# Altium footprint library ParsaLibrary.PcbLib: 526 footprints (part 31 of 33)
Each footprint in its own frame and in the unit in brackets; x right, y up, seen from the top. Pads: shape width x height; smd on the part's side, far side on the other; paste and mask are expansions set on the pad; w line width, h text height; cw(c..) or ccw(c..) is an arc to the next point about the centre after c.
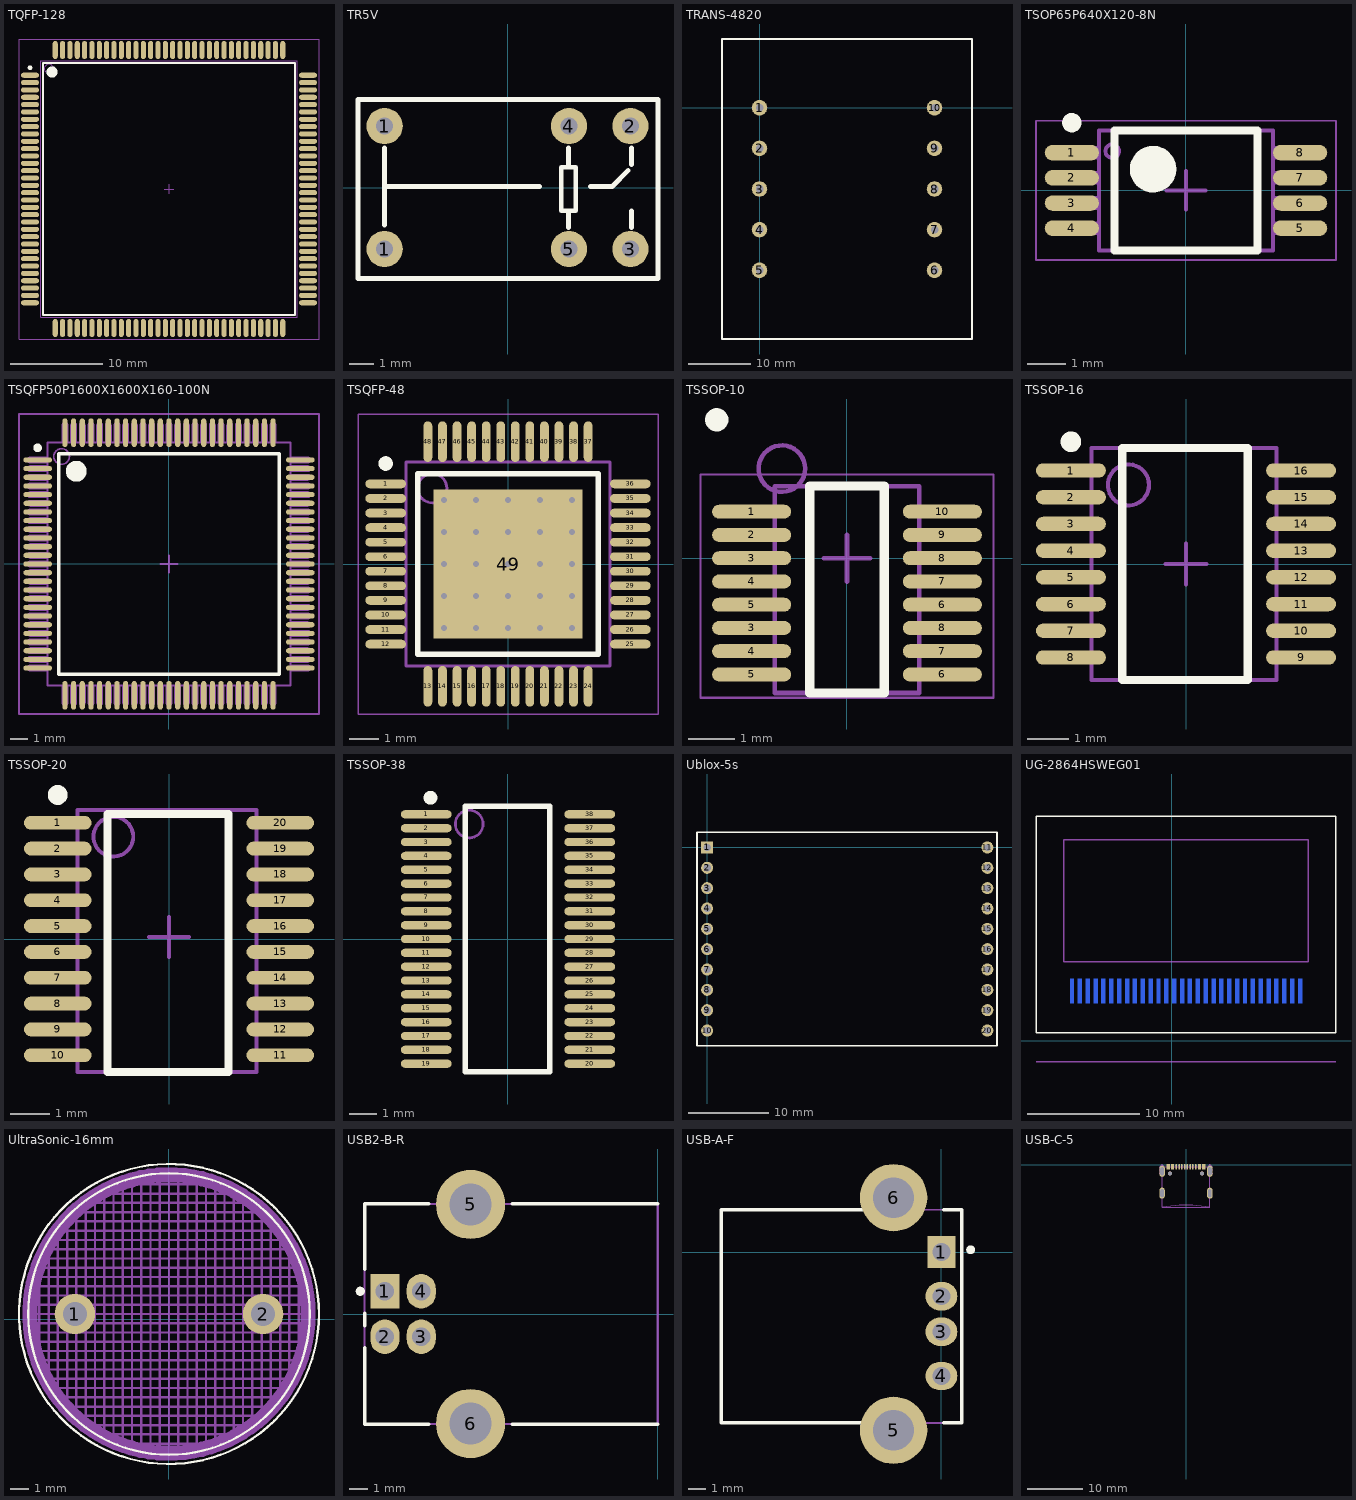
[diagram p30: the footprints below, top view; thin cyan lines are the x and y axes]

## TQFP-128 [mm]
pads (128):
  oval 1.95x0.55 smd: 1(-1116.062,-1183.305) 2(-1116.062,-1184.105) 3(-1116.062,-1184.905) 4(-1116.062,-1185.705) 5(-1116.062,-1186.505) 6(-1116.062,-1187.305) 7(-1116.062,-1188.105) 8(-1116.062,-1188.905) 9(-1116.062,-1189.705) 10(-1116.062,-1190.505) 11(-1116.062,-1191.305) 12(-1116.062,-1192.105) 13(-1116.062,-1192.905) 14(-1116.062,-1193.705) 15(-1116.062,-1194.505) 16(-1116.062,-1195.305) 17(-1116.062,-1196.105) 18(-1116.062,-1196.905) 19(-1116.062,-1197.705) 20(-1116.062,-1198.505) 21(-1116.062,-1199.305) 22(-1116.062,-1200.105) 23(-1116.062,-1200.905) 24(-1116.062,-1201.705) 25(-1116.062,-1202.505) 26(-1116.062,-1203.305) 27(-1116.062,-1204.105) 28(-1116.062,-1204.905) 29(-1116.062,-1205.705) 30(-1116.062,-1206.505) 31(-1116.062,-1207.305) 32(-1116.062,-1208.105) 65(-1085.762,-1208.105) 66(-1085.762,-1207.305) 67(-1085.762,-1206.505) 68(-1085.762,-1205.705) 69(-1085.762,-1204.905) 70(-1085.762,-1204.105) 71(-1085.762,-1203.305) 72(-1085.762,-1202.505) 73(-1085.762,-1201.705) 74(-1085.762,-1200.905) 75(-1085.762,-1200.105) 76(-1085.762,-1199.305) 77(-1085.762,-1198.505) 78(-1085.762,-1197.705) 79(-1085.762,-1196.905) 80(-1085.762,-1196.105) 81(-1085.762,-1195.305) 82(-1085.762,-1194.505) 83(-1085.762,-1193.705) 84(-1085.762,-1192.905) 85(-1085.762,-1192.105) 86(-1085.762,-1191.305) 87(-1085.762,-1190.505) 88(-1085.762,-1189.705) 89(-1085.762,-1188.905) 90(-1085.762,-1188.105) 91(-1085.762,-1187.305) 92(-1085.762,-1186.505) 93(-1085.762,-1185.705) 94(-1085.762,-1184.905) 95(-1085.762,-1184.105) 96(-1085.762,-1183.305)
  oval 0.55x1.95 smd: 33(-1113.312,-1210.855) 34(-1112.512,-1210.855) 35(-1111.712,-1210.855) 36(-1110.912,-1210.855) 37(-1110.112,-1210.855) 38(-1109.312,-1210.855) 39(-1108.512,-1210.855) 40(-1107.712,-1210.855) 41(-1106.912,-1210.855) 42(-1106.112,-1210.855) 43(-1105.312,-1210.855) 44(-1104.512,-1210.855) 45(-1103.712,-1210.855) 46(-1102.912,-1210.855) 47(-1102.112,-1210.855) 48(-1101.312,-1210.855) 49(-1100.512,-1210.855) 50(-1099.712,-1210.855) 51(-1098.912,-1210.855) 52(-1098.112,-1210.855) 53(-1097.312,-1210.855) 54(-1096.512,-1210.855) 55(-1095.712,-1210.855) 56(-1094.912,-1210.855) 57(-1094.112,-1210.855) 58(-1093.312,-1210.855) 59(-1092.512,-1210.855) 60(-1091.712,-1210.855) 61(-1090.912,-1210.855) 62(-1090.112,-1210.855) 63(-1089.312,-1210.855) 64(-1088.512,-1210.855) 97(-1088.512,-1180.555) 98(-1089.312,-1180.555) 99(-1090.112,-1180.555) 100(-1090.912,-1180.555) 101(-1091.712,-1180.555) 102(-1092.512,-1180.555) 103(-1093.312,-1180.555) 104(-1094.112,-1180.555) 105(-1094.912,-1180.555) 106(-1095.712,-1180.555) 107(-1096.512,-1180.555) 108(-1097.312,-1180.555) 109(-1098.112,-1180.555) 110(-1098.912,-1180.555) 111(-1099.712,-1180.555) 112(-1100.512,-1180.555) 113(-1101.312,-1180.555) 114(-1102.112,-1180.555) 115(-1102.912,-1180.555) 116(-1103.712,-1180.555) 117(-1104.512,-1180.555) 118(-1105.312,-1180.555) 119(-1106.112,-1180.555) 120(-1106.912,-1180.555) 121(-1107.712,-1180.555) 122(-1108.512,-1180.555) 123(-1109.312,-1180.555) 124(-1110.112,-1180.555) 125(-1110.912,-1180.555) 126(-1111.712,-1180.555) 127(-1112.512,-1180.555) 128(-1113.312,-1180.555)
Top Overlay:
  circle w0.6: c-1113.662,-1182.955 r0.3
  circle w0.25: c-1116.062,-1182.48 r0.125
  lines w0.2: -1114.662,-1209.455 -1087.162,-1209.455 -1087.162,-1181.955 -1114.662,-1181.955 -1114.662,-1209.455
Mechanical 13:
  circle w0.1: c-1114.012,-1182.605 r0.5
  lines w0.1: -1114.912,-1209.705 -1086.912,-1209.705 -1086.912,-1181.705 -1114.912,-1181.705 -1114.912,-1209.705
Mechanical 15:
  lines w0.1: -1101.412,-1195.705 -1100.412,-1195.705 ; -1100.912,-1196.205 -1100.912,-1195.205 ; -1117.262,-1212.055 -1084.562,-1212.055 -1084.562,-1179.355 -1117.262,-1179.355 -1117.262,-1212.055

## TR5V [mm] "TIANBAO RELAY"
pads (6):
  round 1.5 hole 0.7: 1(-5.08,-2.54) 1(-5.08,2.54) 2(5.08,2.54) 3(5.08,-2.54) 4(2.54,2.54) 5(2.54,-2.54)
Top Overlay:
  lines w0.2: -5.08,-1.56 -5.08,1.64 ; -5.08,0.04 1.32,0.04 ; 2.52,-1.66 2.52,-0.96 ; 2.52,0.84 2.52,1.64 ; 3.42,0.04 4.32,0.04 4.99,0.71 ; 5.12,-1.66 5.12,-0.96 ; 5.12,0.94 5.12,1.64 ; 2.52,-0.96 2.22,-0.96 2.22,0.84 2.82,0.84 2.82,-0.86 2.82,-0.96 2.52,-0.96 ; -6.18,-3.76 6.22,-3.76 6.22,3.64 -6.18,3.64 -6.18,-3.76
3D body "User Library-TR5V L-S-Z.step": height 10, standoff -3.5, extent -6.2,-3.7 6.2,3.7

## TRANS-4820 [mm]
pads (10):
  round 2.5 hole 1.2: 1(0,0) 2(0,-6.5) 3(0,-13) 4(0,-19.5) 5(0,-26) 6(28,-26) 7(28,-19.5) 8(28,-13) 9(28,-6.5) 10(28,0)
Top Overlay:
  lines w0.254: -6,-37 34,-37 34,11 -6,11 -6,-37

## TSOP65P640X120-8N [mm]
pads (8):
  oval 1.4x0.4 smd: 1(-2.95,0.975) 2(-2.95,0.325) 3(-2.95,-0.325) 4(-2.95,-0.975) 5(2.95,-0.975) 6(2.95,-0.325) 7(2.95,0.325) 8(2.95,0.975)
Top Overlay:
  circle w0.6: c-0.85,0.55 r0.3
  circle w0.25: c-2.95,1.75 r0.125
  lines w0.2: -1.85,-1.55 1.85,-1.55 1.85,1.55 -1.85,1.55 -1.85,-1.55
Mechanical 7:
  circle w0.1: c-1.905,1.016 r0.175
  lines w0.1: -2.25,-1.55 2.25,-1.55 2.25,1.55 -2.25,1.55 -2.25,-1.55
  lines w0.102: -2.25,-1.1 -3.25,-1.1 -3.25,-0.85 -2.25,-0.85 ; -2.25,-0.45 -3.25,-0.45 -3.25,-0.2 -2.25,-0.2 ; -2.25,0.2 -3.25,0.2 -3.25,0.45 -2.25,0.45 ; -2.25,0.85 -3.25,0.85 -3.25,1.1 -2.25,1.1 ; 2.25,-1.1 3.25,-1.1 3.25,-0.85 2.25,-0.85 ; 2.25,-0.45 3.25,-0.45 3.25,-0.2 2.25,-0.2 ; 2.25,0.2 3.25,0.2 3.25,0.45 2.25,0.45 ; 2.25,0.85 3.25,0.85 3.25,1.1 2.25,1.1
  text ".Designator" at -0.559,-0.178 h0.38
Mechanical 15:
  lines w0.05: -3.875,-1.8 3.875,-1.8 3.875,1.8 -3.875,1.8 -3.875,-1.8
  lines w0.1: -0.5,0 0.5,0 ; 0,-0.5 0,0.5
3D body "TSOP65P640X120-8N_asfdasdf.step": height 1.2, standoff 0, extent -3.2,-1.55 3.2,1.55

## TSQFP50P1600X1600X160-100N [mm]
pads (100):
  oval 1.65x0.3 smd mask+0.05: 1(-7.575,6) 2(-7.575,5.5) 3(-7.575,5) 4(-7.575,4.5) 5(-7.575,4) 6(-7.575,3.5) 7(-7.575,3) 8(-7.575,2.5) 9(-7.575,2) 10(-7.575,1.5) 11(-7.575,1) 12(-7.575,0.5) 13(-7.575,0) 14(-7.575,-0.5) 15(-7.575,-1) 16(-7.575,-1.5) 17(-7.575,-2) 18(-7.575,-2.5) 19(-7.575,-3) 20(-7.575,-3.5) 21(-7.575,-4) 22(-7.575,-4.5) 23(-7.575,-5) 24(-7.575,-5.5) 25(-7.575,-6) 51(7.575,-6) 52(7.575,-5.5) 53(7.575,-5) 54(7.575,-4.5) 55(7.575,-4) 56(7.575,-3.5) 57(7.575,-3) 58(7.575,-2.5) 59(7.575,-2) 60(7.575,-1.5) 61(7.575,-1) 62(7.575,-0.5) 63(7.575,0) 64(7.575,0.5) 65(7.575,1) 66(7.575,1.5) 67(7.575,2) 68(7.575,2.5) 69(7.575,3) 70(7.575,3.5) 71(7.575,4) 72(7.575,4.5) 73(7.575,5) 74(7.575,5.5) 75(7.575,6)
  oval 0.3x1.65 smd mask+0.05: 26(-6,-7.575) 27(-5.5,-7.575) 28(-5,-7.575) 29(-4.5,-7.575) 30(-4,-7.575) 31(-3.5,-7.575) 32(-3,-7.575) 33(-2.5,-7.575) 34(-2,-7.575) 35(-1.5,-7.575) 36(-1,-7.575) 37(-0.5,-7.575) 38(0,-7.575) 39(0.5,-7.575) 40(1,-7.575) 41(1.5,-7.575) 42(2,-7.575) 43(2.5,-7.575) 44(3,-7.575) 45(3.5,-7.575) 46(4,-7.575) 47(4.5,-7.575) 48(5,-7.575) 49(5.5,-7.575) 50(6,-7.575) 76(6,7.575) 77(5.5,7.575) 78(5,7.575) 79(4.5,7.575) 80(4,7.575) 81(3.5,7.575) 82(3,7.575) 83(2.5,7.575) 84(2,7.575) 85(1.5,7.575) 86(1,7.575) 87(0.5,7.575) 88(0,7.575) 89(-0.5,7.575) 90(-1,7.575) 91(-1.5,7.575) 92(-2,7.575) 93(-2.5,7.575) 94(-3,7.575) 95(-3.5,7.575) 96(-4,7.575) 97(-4.5,7.575) 98(-5,7.575) 99(-5.5,7.575) 100(-6,7.575)
Top Overlay:
  circle w0.25: c-7.575,6.7 r0.125
  circle w0.6: c-5.35,5.35 r0.3
  lines w0.2: -6.35,-6.35 -6.35,6.35 6.35,6.35 6.35,-6.35 -6.35,-6.35
Mechanical 7:
  drawing of 405 lines, arcs and shapes, not listed
Mechanical 15:
  lines w0.1: -0.5,0 0.5,0 ; 0,-0.5 0,0.5 ; -8.65,-8.65 -8.65,8.65 8.65,8.65 8.65,-8.65 -8.65,-8.65
3D body "User Library-LQFP-100 (2).step": height 1.6, standoff 0, extent -8.001,-8 7.999,8

## TSQFP-48 [mm] "TSQFP, 48-Leads, Body 7.00x7.00mm, Pitch 0.50mm, Thermal Pad 5.10x5.10mm, IPC Medium Density"
height 1.2
pads (49):
  oval 1.4x0.3 smd: 1(-4.2,2.75) 2(-4.2,2.25) 3(-4.2,1.75) 4(-4.2,1.25) 5(-4.2,0.75) 6(-4.2,0.25) 7(-4.2,-0.25) 8(-4.2,-0.75) 9(-4.2,-1.25) 10(-4.2,-1.75) 11(-4.2,-2.25) 12(-4.2,-2.75) 25(4.2,-2.75) 26(4.2,-2.25) 27(4.2,-1.75) 28(4.2,-1.25) 29(4.2,-0.75) 30(4.2,-0.25) 31(4.2,0.25) 32(4.2,0.75) 33(4.2,1.25) 34(4.2,1.75) 35(4.2,2.25) 36(4.2,2.75)
  oval 0.3x1.4 smd: 13(-2.75,-4.2) 14(-2.25,-4.2) 15(-1.75,-4.2) 16(-1.25,-4.2) 17(-0.75,-4.2) 18(-0.25,-4.2) 19(0.25,-4.2) 20(0.75,-4.2) 21(1.25,-4.2) 22(1.75,-4.2) 23(2.25,-4.2) 24(2.75,-4.2) 37(2.75,4.2) 38(2.25,4.2) 39(1.75,4.2) 40(1.25,4.2) 41(0.75,4.2) 42(0.25,4.2) 43(-0.25,4.2) 44(-0.75,4.2) 45(-1.25,4.2) 46(-1.75,4.2) 47(-2.25,4.2) 48(-2.75,4.2)
  rect 5.1x5.1 smd: 49(0,0)
via 2.2,-2.2 diameter 0.5 hole 0.2
via 1.1,-2.2 diameter 0.5 hole 0.2
via 0,-2.2 diameter 0.5 hole 0.2
via -1.1,-2.2 diameter 0.5 hole 0.2
via -2.2,-2.2 diameter 0.5 hole 0.2
via 2.2,-1.1 diameter 0.5 hole 0.2
via 1.1,-1.1 diameter 0.5 hole 0.2
via 0,-1.1 diameter 0.5 hole 0.2
via -1.1,-1.1 diameter 0.5 hole 0.2
via -2.2,-1.1 diameter 0.5 hole 0.2
via 2.2,0 diameter 0.5 hole 0.2
via 1.1,0 diameter 0.5 hole 0.2
via 0,0 diameter 0.5 hole 0.2
via -1.1,0 diameter 0.5 hole 0.2
via -2.2,0 diameter 0.5 hole 0.2
via 2.2,1.1 diameter 0.5 hole 0.2
via 1.1,1.1 diameter 0.5 hole 0.2
via 0,1.1 diameter 0.5 hole 0.2
via -1.1,1.1 diameter 0.5 hole 0.2
via -2.2,1.1 diameter 0.5 hole 0.2
via 2.2,2.2 diameter 0.5 hole 0.2
via 1.1,2.2 diameter 0.5 hole 0.2
via 0,2.2 diameter 0.5 hole 0.2
via -1.1,2.2 diameter 0.5 hole 0.2
via -2.2,2.2 diameter 0.5 hole 0.2
Top Overlay:
  circle w0.25: c-4.2,3.45 r0.125
  lines w0.2: -3.1,-3.1 3.1,-3.1 3.1,3.1 -3.1,3.1 -3.1,-3.1
Mechanical 13:
  circle w0.1: c-2.6,2.6 r0.5
  lines w0.1: -3.5,-3.5 3.5,-3.5 3.5,3.5 -3.5,3.5 -3.5,-3.5
Mechanical 15:
  lines w0.05: -5.15,-5.15 5.15,-5.15 5.15,5.15 -5.15,5.15 -5.15,-5.15
  lines w0.1: -0.5,0 0.5,0 ; 0,-0.5 0,0.5
3D body "TSQFP-48.step": height 1.2, standoff 0, extent -4.5,-4.5 4.5,4.5

## TSSOP-10 [mm]
pads (16):
  oval 1.7x0.3 smd: 1(-2.05,1) 2(-2.05,0.5) 3(-2.05,-1.5) 3(-2.05,0) 4(-2.05,-2) 4(-2.05,-0.5) 5(-2.05,-2.5) 5(-2.05,-1) 6(2.05,-2.5) 6(2.05,-1) 7(2.05,-2) 7(2.05,-0.5) 8(2.05,-1.5) 8(2.05,0) 9(2.05,0.5) 10(2.05,1)
Top Overlay:
  circle w0.25: c-2.8,2.975 r0.125
  lines w0.2: -0.8,-2.9 -0.8,1.55 0.8,1.55 0.8,-2.9 -0.8,-2.9
Mechanical 13:
  circle w0.1: c-1.4,1.925 r0.5
  lines w0.1: -1.55,-2.9 -1.55,1.55 1.55,1.55 1.55,-2.9 -1.55,-2.9
Mechanical 15:
  lines w0.05: -3.15,-3 3.15,-3 3.15,1.8 -3.15,1.8 -3.15,-3
  lines w0.1: -0.5,0 0.5,0 ; 0,-0.5 0,0.5

## TSSOP-16 [mm]
pads (16):
  oval 1.7x0.35 smd: 1(-2.8,2.275) 2(-2.8,1.625) 3(-2.8,0.975) 4(-2.8,0.325) 5(-2.8,-0.325) 6(-2.8,-0.975) 7(-2.8,-1.625) 8(-2.8,-2.275) 9(2.8,-2.275) 10(2.8,-1.625) 11(2.8,-0.975) 12(2.8,-0.325) 13(2.8,0.325) 14(2.8,0.975) 15(2.8,1.625) 16(2.8,2.275)
Top Overlay:
  circle w0.25: c-2.8,2.975 r0.125
  lines w0.2: -1.55,-2.825 -1.55,2.825 1.5,2.825 1.5,-2.825 -1.55,-2.825
Mechanical 13:
  circle w0.1: c-1.4,1.925 r0.5
  lines w0.1: -2.3,-2.825 -2.3,2.825 2.2,2.825 2.2,-2.825 -2.3,-2.825
Mechanical 15:
  lines w0.1: -0.5,0 0.5,0 ; 0,-0.5 0,0.5
3D body "User Library-TSSOP-16-1.step": height 1.1, standoff 0, extent -3.2,-2.5 3.2,2.5

## TSSOP-20 [mm]
pads (20):
  oval 1.7x0.35 smd: 1(-2.8,2.925) 2(-2.8,2.275) 3(-2.8,1.625) 4(-2.8,0.975) 5(-2.8,0.325) 6(-2.8,-0.325) 7(-2.8,-0.975) 8(-2.8,-1.625) 9(-2.8,-2.275) 10(-2.8,-2.925) 11(2.8,-2.925) 12(2.8,-2.275) 13(2.8,-1.625) 14(2.8,-0.975) 15(2.8,-0.325) 16(2.8,0.325) 17(2.8,0.975) 18(2.8,1.625) 19(2.8,2.275) 20(2.8,2.925)
Top Overlay:
  circle w0.25: c-2.8,3.625 r0.125
  lines w0.2: -1.55,-3.35 -1.55,3.15 1.5,3.15 1.5,-3.35 -1.55,-3.35
Mechanical 13:
  circle w0.1: c-1.4,2.575 r0.5
  lines w0.1: -2.3,-3.35 -2.3,3.25 2.2,3.25 2.2,-3.35 -2.3,-3.35
Mechanical 15:
  lines w0.1: -0.5,0.05 0.5,0.05 ; 0,-0.45 0,0.55
3D body "User Library-TSSOP20.step": height 1.09, standoff 0, extent -3.14,-3.35 3.14,3.15

## TSSOP-38 [mm] "0.5mm Pitch"
pads (38):
  oval 1.83x0.3 smd: 1(-2.95,4.5) 2(-2.95,4) 3(-2.95,3.5) 4(-2.95,3) 5(-2.95,2.5) 6(-2.95,2) 7(-2.95,1.5) 8(-2.95,1) 9(-2.95,0.5) 10(-2.95,0) 11(-2.95,-0.5) 12(-2.95,-1) 13(-2.95,-1.5) 14(-2.95,-2) 15(-2.95,-2.5) 16(-2.95,-3) 17(-2.95,-3.5) 18(-2.95,-4) 19(-2.95,-4.5) 20(2.95,-4.5) 21(2.95,-4) 22(2.95,-3.5) 23(2.95,-3) 24(2.95,-2.5) 25(2.95,-2) 26(2.95,-1.5) 27(2.95,-1) 28(2.95,-0.5) 29(2.95,0) 30(2.95,0.5) 31(2.95,1) 32(2.95,1.5) 33(2.95,2) 34(2.95,2.5) 35(2.95,3) 36(2.95,3.5) 37(2.95,4) 38(2.95,4.5)
Top Overlay:
  circle w0.25: c-2.8,5.1 r0.125
  lines w0.2: -1.55,-4.8 1.5,-4.8 1.5,4.8 -1.55,4.8 -1.55,-4.8
Mechanical 13:
  circle w0.1: c-1.4,4.15 r0.5
3D body "TSSOP-38 0.50p 4.4mm.step": height 1, standoff 0, extent -3.15,-4.85 3.15,4.85

## Ublox-5s [mm] "Ublox-5s GPS Module"
pads (20):
  rect 1.5x1.5 hole 0.9: 1(0,0)
  round 1.5 hole 0.9: 2(0,-2.54) 3(0,-5.08) 4(0,-7.62) 5(0,-10.16) 6(0,-12.7) 7(0,-15.24) 8(0,-17.78) 9(0,-20.32) 10(0,-22.86) 11(35,0) 12(35,-2.54) 13(35,-5.08) 14(35,-7.62) 15(35,-10.16) 16(35,-12.7) 17(35,-15.24) 18(35,-17.78) 19(35,-20.32) 20(35,-22.86)
Top Overlay:
  lines w0.2: -1.27,-24.765 -1.27,1.905 36.195,1.905 36.195,-0.635 36.195,-24.765 -1.27,-24.765

## UG-2864HSWEG01 [mm] "0.96INCH OLED 128x64"
pads (30):
  rect 0.35x2.2 smd far side: 1(-8.878,4.437) 2(-8.178,4.437) 3(-7.478,4.437) 4(-6.778,4.437) 5(-6.078,4.437) 6(-5.378,4.437) 7(-4.678,4.437) 8(-3.978,4.437) 9(-3.278,4.437) 10(-2.578,4.437) 11(-1.878,4.437) 12(-1.178,4.437) 13(-0.478,4.437) 14(0.222,4.437) 15(0.922,4.437) 16(1.622,4.437) 17(2.322,4.437) 18(3.022,4.437) 19(3.722,4.437) 20(4.422,4.437) 21(5.122,4.437) 22(5.822,4.437) 23(6.522,4.437) 24(7.222,4.437) 25(7.922,4.437) 26(8.622,4.437) 27(9.322,4.437) 28(10.022,4.437) 29(10.722,4.437) 30(11.422,4.437)
Top Overlay:
  lines w0.127: -12.081,19.997 14.622,19.997 14.622,0.737 -12.078,0.737 -12.081,19.997
Mechanical 16:
  lines w0.127: -12.078,-1.863 14.622,-1.863 ; -9.6,7.033 12.144,7.033 12.144,17.897 -9.6,17.897 -9.6,7.033
  text "PCB EDGE (1.6mm)" at -3.928,-1.363 h1.26
Mechanical 30:
  text "1" at -8.678,6.149 h0.69
  text "10" at -2.378,6.049 h0.69
  text "20" at 4.572,6.049 h0.69
  text "30" at 11.722,6.049 h0.69
3D body "User Library-096OLED.step": height 2.02, standoff -1.82, extent -12.05,-2.216 14.65,20

## UltraSonic-16mm [mil]
pads (2):
  round 86 hole 51.18: 1(-198.94,11.06) 2(201.06,11.06)
Top Overlay:
  circle w5: c1.06,11.06 r299.32
  circle w5: c1.06,11.06 r318.9
Mechanical 1:
  circle w32: c1.06,11.06 r295.93
  lines w5: -294.22,-8.63 296.34,-8.63 ; -294.22,11.06 296.34,11.06 ; -294.22,30.75 296.34,30.75 ; -294.22,50.43 296.34,50.43 ; -274.53,-87.37 276.65,-87.37 276.65,109.49 -274.53,109.49 -274.53,-107.05 276.65,-107.05 ; -274.53,-67.68 276.65,-67.68 ; -274.53,-48 276.65,-48 ; -274.53,-28.31 276.65,-28.31 ; -274.53,70.12 276.65,70.12 ; -274.53,89.8 276.65,89.8 ; -254.85,-126.74 256.97,-126.74 256.97,148.86 -254.85,148.86 -254.85,-146.42 256.97,-146.42 ; -254.85,129.17 256.97,129.17 ; -235.16,168.54 237.28,168.54 ; -38.31,306.34 -38.31,-284.22 -18.63,-284.22 ; 40.43,-284.22 40.43,-264.53 ; 40.43,306.34 40.43,286.65 ; -156.42,-225.16 -156.42,247.28 ; -156.42,-225.16 -176.11,-225.16 -176.11,247.28 -156.42,247.28 ; -156.42,-225.16 158.54,-225.16 ; -156.42,247.28 158.54,247.28 ; -117.05,-244.85 -117.05,266.97 ; -117.05,-244.85 119.17,-244.85 ; -117.05,-244.85 -136.74,-244.85 -136.74,266.97 -117.05,266.97 ; -117.05,266.97 99.49,266.97 ; -77.68,-264.53 -77.68,286.65 ; -77.68,-264.53 -58,-264.53 ; -77.68,-264.53 -97.37,-264.53 -97.37,286.65 -77.68,286.65 ; -77.68,286.65 -58,286.65 ; -58,-264.53 -58,286.65 ; -58,-264.53 40.43,-264.53 ; -58,286.65 20.75,286.65 ; -18.63,-284.22 1.06,-284.22 ; -18.63,-284.22 -18.63,306.34 1.06,306.34 ; 1.06,-284.22 1.06,306.34 ; 1.06,-284.22 20.75,-284.22 20.75,286.65 ; 1.06,306.34 20.75,306.34 20.75,286.65 ; 20.75,286.65 40.43,286.65 ; 40.43,-264.53 40.43,286.65 ; 40.43,-264.53 60.12,-264.53 ; 40.43,286.65 79.8,286.65 ; 60.12,-264.53 60.12,286.65 79.8,286.65 ; 60.12,-264.53 99.49,-264.53 ; 79.8,286.65 79.8,-264.53 99.49,-264.53 ; 79.8,286.65 99.49,286.65 99.49,266.97 ; 99.49,-264.53 99.49,266.97 ; 99.49,-264.53 99.49,-244.85 119.17,-244.85 ; 99.49,266.97 119.17,266.97 ; 119.17,-244.85 119.17,266.97 ; 119.17,-244.85 138.86,-244.85 138.86,266.97 119.17,266.97 ; 158.54,-225.16 158.54,247.28 ; 158.54,-225.16 178.23,-225.16 178.23,247.28 158.54,247.28 ; -235.16,-166.11 -235.16,188.23 237.28,188.23 237.28,-166.11 -235.16,-166.11 ; -215.48,-185.79 -215.48,207.91 217.6,207.91 217.6,-185.79 -215.48,-185.79 ; -195.79,-205.48 -195.79,227.6 197.91,227.6 197.91,-205.48 -195.79,-205.48
3D body "User Library-400PT160.step": height 472.44, standoff -393.7, extent -318.89,-318.89 318.9,318.9

## USB2-B-R [mm] "Connector; USB1.1, Type B, Thru-Hole; 4 Position; Right Angle"
height 10.95
pads (6):
  rect 1.6x1.9 hole 1: 1(-15.01,1.25)
  oval 1.6x1.9 hole 1: 2(-15.01,-1.25) 3(-13.01,-1.25) 4(-13.01,1.25)
  round 3.8 hole 2.3: 5(-10.3,6.02) 6(-10.3,-6.02)
Top Overlay:
  circle w0.25: c-16.36,1.25 r0.125
  lines w0.2: -16.12,-1.85 -16.12,-6.05 -12.6,-6.05 ; -16.12,-0.65 -16.12,0.05 ; -16.12,2.45 -16.12,6.05 -12.6,6.05 ; -8,-6.05 -0.02,-6.05 ; -8,6.05 -0.02,6.05
Mechanical 1:
  lines w0.1: 0,-6.05 0,6.05
  text "PCB Edge" at -0.325,-5.651 h0.25
Mechanical 13:
  lines w0.1: -16.12,-6.05 -0.02,-6.05 -0.02,6.05 -16.12,6.05 -16.12,-6.05
3D body "14389.STEP": height 10.95, standoff -3.7, extent -16.51,-7.45 -0.01,7.45

## USB-A-F [mm]
pads (6):
  rect 1.6x1.8 hole 1: 1(0,0)
  oval 1.8x1.6 hole 1: 2(0,-2.5) 3(0,-4.5) 4(0,-7)
  round 3.8 hole 2.3: 5(-2.7,-10.07) 6(-2.7,3.07)
Top Overlay:
  circle w0.25: c1.651,0.127 r0.125
  lines w0.2: -4.459,-9.652 -12.439,-9.652 -12.439,2.388 -4.459,2.388 ; 0.141,-9.652 1.143,-9.652 1.143,2.388 0.141,2.388
Mechanical 13:
  lines w0.1: -12.439,-9.652 -12.439,2.388 1.143,2.388 1.143,-9.652 -12.439,-9.652
3D body "USB A.STEP": height 6.95, standoff -4.2, extent -12.573,-11.456 1.127,4.344

## USB-C-5 [mm] "USB-C-16P-5"
pads (18):
  oval 1x2 hole 0.6 slot 1.4 at 90 deg: 0(-4.331,-5.113) 0(-4.32,-1.155) 0(4.309,-5.113) 0(4.32,-1.155)
  rect 0.6x1 smd: 1(-3.225,-0.34) 2(-2.45,-0.34) 11(2.45,-0.34) 12(3.225,-0.34)
  rect 0.3x1 smd: 4(-1.25,-0.34) 5(-0.75,-0.34) 6(-0.25,-0.34) 7(0.25,-0.34) 8(0.75,-0.34) 10(1.75,-0.34) A8(1.25,-0.34) B8(-1.75,-0.34)
  round 0.7 hole 0.7: h(-2.91,-1.537) h(2.91,-1.537)
Mechanical 3:
  region: -3.425,-0.595 -3.425,-0.095 -3.025,-0.095 -3.025,-0.595
  region: -2.65,-0.595 -2.65,-0.095 -2.25,-0.095 -2.25,-0.595
  region: -1.85,-0.595 -1.85,-0.095 -1.65,-0.095 -1.65,-0.595
  region: -1.35,-0.595 -1.35,-0.095 -1.15,-0.095 -1.15,-0.595
  region: -0.85,-0.595 -0.85,-0.095 -0.65,-0.095 -0.65,-0.595
  region: -0.35,-0.595 -0.35,-0.095 -0.15,-0.095 -0.15,-0.595
  region: 0.15,-0.595 0.15,-0.095 0.35,-0.095 0.35,-0.595
  region: 0.65,-0.595 0.65,-0.095 0.85,-0.095 0.85,-0.595
  region: 1.15,-0.6 1.15,-0.1 1.35,-0.1 1.35,-0.6
  region: 1.65,-0.6 1.65,-0.1 1.85,-0.1 1.85,-0.6
  region: 2.25,-0.595 2.25,-0.095 2.65,-0.095 2.65,-0.595
  region: 3.025,-0.595 3.025,-0.095 3.425,-0.095 3.425,-0.595
  lines w0.01: -4.82,-1.515 -3.82,-1.515 ; -4.82,-0.915 -3.82,-0.915 ; -4.82,-0.315 -3.82,-0.315 ; -4.331,-5.994 -4.331,-4.393 ; -4.32,-1.965 -4.32,-0.345 -4.32,0.135 ; 3.82,-1.515 4.82,-1.515 ; 3.82,-0.915 4.82,-0.915 ; 3.82,-0.315 4.82,-0.315 ; 4.32,-1.965 4.32,-0.345 4.32,0.135
  lines w0.152: -4.32,-7.7 cw(c0,-30.692) 4.32,-7.7 ; -4.32,-7.695 -4.32,-0.345 4.32,-0.345 4.32,-7.695 -4.32,-7.695
Mechanical 4:
  lines w0.01: -4.62,-0.915 -4.02,-0.915 ; -4.32,-1.765 -4.32,-0.065 ; 4.02,-0.915 4.62,-0.915 ; 4.32,-1.765 4.32,-0.065
Route Tool Path:
  lines w0.01: -4.62,-1.465 ccw(c-4.32,-1.465) -4.02,-1.465 -4.02,-0.365 ccw(c-4.32,-0.365) -4.62,-0.365 -4.62,-1.465 ; 4.02,-1.465 ccw(c4.32,-1.465) 4.62,-1.465 4.62,-0.365 ccw(c4.32,-0.365) 4.02,-0.365 4.02,-1.465
3D body "User Library-USB - C.step": height 3.26, standoff -1, extent -4.48,-7.822 4.47,-0.072